# Altium footprint library UD2 CPLD.PcbLib: 43 footprints (part 3 of 3)
Each footprint in its own frame and in the unit in brackets; x right, y up, seen from the top. Pads: shape width x height; smd on the part's side, far side on the other; paste and mask are expansions set on the pad; w line width, h text height; cw(c..) or ccw(c..) is an arc to the next point about the centre after c.
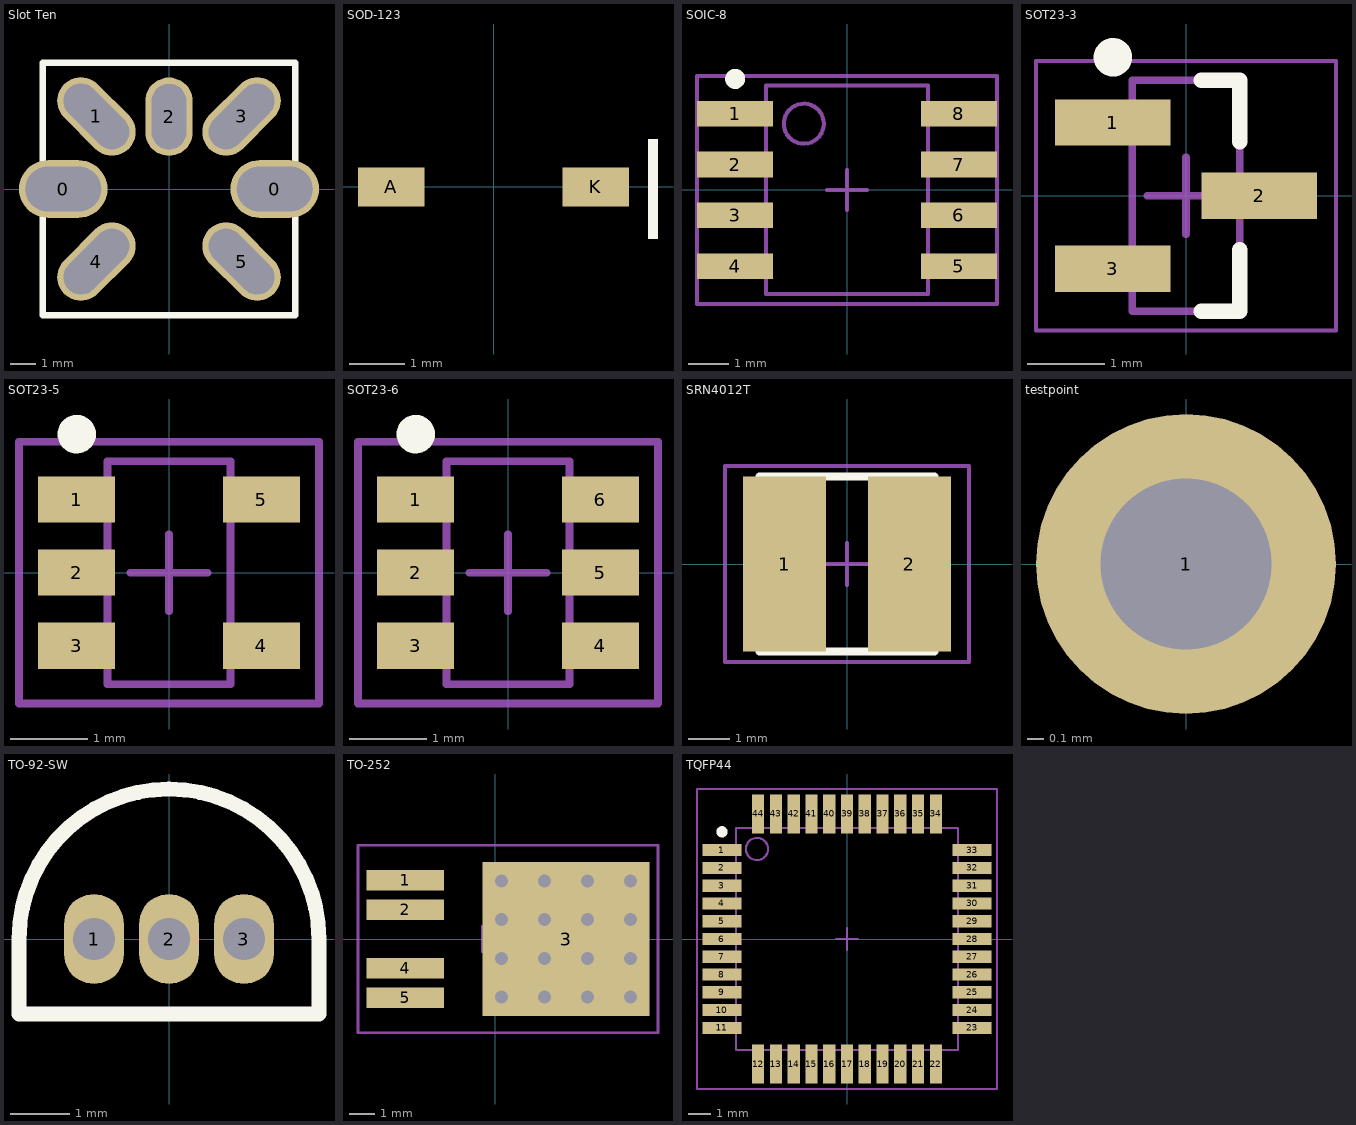
[diagram p2: the footprints below, top view; thin cyan lines are the x and y axes]

## Slot Ten [mil]
pads (7):
  oval 138.11x90 hole 70 slot 118.11 at 0 deg: 0(-165.01,0) 0(165.01,0)
  oval 142.54x74 hole 54 slot 122.54 at 135 deg rot 135: 1(-113.25,113.25) 5(113.25,-113.25)
  oval 74x122.42 hole 54 slot 102.42 at 90 deg: 2(0,112.79)
  oval 142.54x74 hole 54 slot 122.54 at 45 deg rot 45: 3(113.25,113.25) 4(-113.25,-113.25)
Top Overlay:
  lines w10: -196.85,-196.85 -196.85,196.85 196.85,196.85 196.85,-196.85 -196.85,-196.85
3D body: height 514.38, standoff -100.19, extent -149.61,-149.61 149.61,149.61
3D body: height 38, standoff -122, extent 52.58,52.58 124.58,124.58
3D body: height 38, standoff -122, extent 52.58,-124.58 124.58,-52.58
3D body: height 38, standoff -122, extent -124.58,-124.58 -52.58,-52.58
3D body: height 38, standoff -122, extent -124.58,52.58 -52.58,124.58

## SOD-123 [mm]
pads (2):
  rect 1.2x0.7 smd: A(-1.85,0) K(1.85,0)
Top Overlay:
  rectangle: 2.794,-0.94 2.972,0.864
3D body: height 1.42, standoff -0.03, extent -1.925,-0.85 1.925,0.85

## SOIC-8 [mm] "Tall SO-8"
height 3.302
pads (8):
  rect 1.9x0.64 smd: 1(-2.795,1.905) 2(-2.795,0.635) 3(-2.795,-0.635) 4(-2.795,-1.905) 5(2.795,-1.905) 6(2.795,-0.635) 7(2.795,0.635) 8(2.795,1.905)
Top Overlay:
  circle w0.25: c-2.795,2.775 r0.125
Mechanical 13:
  circle w0.1: c-1.08,1.655 r0.5
  lines w0.1: -0.5,0 0.5,0 ; 0,-0.5 0,0.5 ; -3.75,-2.85 3.75,-2.85 3.75,2.85 -3.75,2.85 -3.75,-2.85 ; -2.03,-2.605 2.03,-2.605 2.03,2.605 -2.03,2.605 -2.03,-2.605
3D body: height 1.75, standoff 0, extent -3.054,-2.448 2.945,2.452

## SOT23-3 [mm] "SOT23, 3-Leads, Body 2.90x2.45mm, Pitch 0.95mm, IPC Medium Density"
height 1.1
pads (3):
  rect 1.5x0.6 smd: 1(-0.95,0.95) 2(0.95,0) 3(-0.95,-0.95)
Top Overlay:
  circle w0.25: c-0.95,1.8 r0.125
  lines w0.2: 0.2,-1.5 0.7,-1.5 0.7,-0.7 ; 0.2,1.5 0.7,1.5 0.7,0.7
Mechanical 13:
  lines w0.1: -0.7,-1.5 0.7,-1.5 0.7,1.5 -0.7,1.5 -0.7,-1.5
Mechanical 15:
  lines w0.05: -1.95,-1.75 1.95,-1.75 1.95,1.75 -1.95,1.75 -1.95,-1.75
  lines w0.1: -0.5,0 0.5,0 ; 0,-0.5 0,0.5
3D body: height 1.3, standoff 0, extent -1.4,-1.45 1.4,1.45

## SOT23-5 [mm]
pads (5):
  rect 1x0.6 smd: 1(-1.2,0.95) 2(-1.2,0) 3(-1.2,-0.95) 4(1.2,-0.95) 5(1.2,0.95)
Top Overlay:
  circle w0.25: c-1.2,1.8 r0.125
Mechanical 13:
  lines w0.1: -0.8,-1.45 -0.8,1.45 0.8,1.45 0.8,-1.45 -0.8,-1.45
Mechanical 15:
  lines w0.1: -0.5,0 0.5,0 ; 0,-0.5 0,0.5 ; -1.95,-1.7 -1.95,1.7 1.95,1.7 1.95,-1.7 -1.95,-1.7
3D body: height 0.94, standoff -0.02, extent -1.595,-1.47 1.595,1.43

## SOT23-6 [mm]
pads (6):
  rect 1x0.6 smd: 1(-1.2,0.95) 2(-1.2,0) 3(-1.2,-0.95) 4(1.2,-0.95) 5(1.2,0) 6(1.2,0.95)
Top Overlay:
  circle w0.25: c-1.2,1.8 r0.125
Mechanical 13:
  lines w0.1: -0.8,-1.45 0.8,-1.45 0.8,1.45 -0.8,1.45 -0.8,-1.45
Mechanical 15:
  lines w0.1: -0.5,0 0.5,0 ; 0,-0.5 0,0.5 ; -1.95,-1.7 1.95,-1.7 1.95,1.7 -1.95,1.7 -1.95,-1.7
3D body: height 1.08, standoff -0.02, extent -1.2,-1.45 1.2,1.45

## SRN4012T [mm]
height 1.2
pads (2):
  rect 2x4.2 smd: 1(-1.5,0) 2(1.5,0)
Top Overlay:
  lines w0.2: -2.1,-2.1 2.1,-2.1 ; -2.1,2.1 2.1,2.1
Mechanical 13:
  lines w0.1: -2.1,-2.1 2.1,-2.1 2.1,2.1 -2.1,2.1 -2.1,-2.1
Mechanical 15:
  lines w0.1: -0.5,0 0.5,0 ; 0,-0.5 0,0.5 ; -2.925,-2.35 2.925,-2.35 2.925,2.35 -2.925,2.35 -2.925,-2.35
3D body: height 1.2, standoff -0.01, extent -2.01,-2.01 2.01,2.01

## testpoint [mil]
pads (1):
  round 70 hole 40: 1(0,0)

## TO-92-SW [mil]
pads (3):
  oval 40x60 hole 28: 1(-50,0) 2(0,0) 3(50,0)
Top Overlay:
  lines w10: -100,-50 -100,0 cw(c0,0) 0,100 cw(c0,0) 100,0 100,-50 -100,-50
3D body: height 334.65, standoff -157.48, extent -97.93,-52.36 97.93,100

## TO-252 [mm] "D-PAK, 5-Pads, Body 6.2x6.7mm (max), IPC Medium Density"
height 2.39
pads (5):
  rect 3x0.8 smd: 1(-3.5,2.28) 2(-3.5,1.14) 4(-3.5,-1.14) 5(-3.5,-2.28)
  rect 6.5x6 smd: 3(2.75,0)
via 0.25,-2.25 diameter 1.016 hole 0.508
via 1.917,-2.25 diameter 1.016 hole 0.508
via 3.583,-2.25 diameter 1.016 hole 0.508
via 5.25,-2.25 diameter 1.016 hole 0.508
via 0.25,-0.75 diameter 1.016 hole 0.508
via 1.917,-0.75 diameter 1.016 hole 0.508
via 3.583,-0.75 diameter 1.016 hole 0.508
via 5.25,-0.75 diameter 1.016 hole 0.508
via 0.25,0.75 diameter 1.016 hole 0.508
via 1.917,0.75 diameter 1.016 hole 0.508
via 3.583,0.75 diameter 1.016 hole 0.508
via 5.25,0.75 diameter 1.016 hole 0.508
via 5.25,2.25 diameter 1.016 hole 0.508
via 3.583,2.25 diameter 1.016 hole 0.508
via 1.917,2.25 diameter 1.016 hole 0.508
via 0.25,2.25 diameter 1.016 hole 0.508
Mechanical 15:
  lines w0.1: -0.5,-0.5 -0.5,0.5 ; -0.5,0 0.5,0 ; -5.334,-3.65 6.325,-3.65 6.325,3.65 -5.334,3.65 -5.334,-3.65
3D body: height 2.3, standoff 0, extent -4.442,-3.25 5.458,3.25

## TQFP44 [mm]
pads (44):
  rect 1.75x0.55 smd: 1(-5.625,4) 2(-5.625,3.2) 3(-5.625,2.4) 4(-5.625,1.6) 5(-5.625,0.8) 6(-5.625,0) 7(-5.625,-0.8) 8(-5.625,-1.6) 9(-5.625,-2.4) 10(-5.625,-3.2) 11(-5.625,-4) 23(5.625,-4) 24(5.625,-3.2) 25(5.625,-2.4) 26(5.625,-1.6) 27(5.625,-0.8) 28(5.625,0) 29(5.625,0.8) 30(5.625,1.6) 31(5.625,2.4) 32(5.625,3.2) 33(5.625,4)
  rect 0.55x1.75 smd: 12(-4,-5.625) 13(-3.2,-5.625) 14(-2.4,-5.625) 15(-1.6,-5.625) 16(-0.8,-5.625) 17(0,-5.625) 18(0.8,-5.625) 19(1.6,-5.625) 20(2.4,-5.625) 21(3.2,-5.625) 22(4,-5.625) 34(4,5.625) 35(3.2,5.625) 36(2.4,5.625) 37(1.6,5.625) 38(0.8,5.625) 39(0,5.625) 40(-0.8,5.625) 41(-1.6,5.625) 42(-2.4,5.625) 43(-3.2,5.625) 44(-4,5.625)
Top Overlay:
  circle w0.25: c-5.625,4.825 r0.125
Mechanical 13:
  circle w0.1: c-4.05,4.05 r0.5
  lines w0.1: -5,-5 -5,5 5,5 5,-5 -5,-5
Mechanical 15:
  lines w0.1: -0.5,0 0.5,0 ; 0,-0.5 0,0.5 ; -6.75,-6.75 -6.75,6.75 6.75,6.75 6.75,-6.75 -6.75,-6.75
3D body: height 1.1, standoff 0, extent -6,-6 6,6